# Altium footprint library General.PcbLib: 446 footprints (part 19 of 28)
Each footprint in its own frame and in the unit in brackets; x right, y up, seen from the top. Pads: shape width x height; smd on the part's side, far side on the other; paste and mask are expansions set on the pad; w line width, h text height; cw(c..) or ccw(c..) is an arc to the next point about the centre after c.
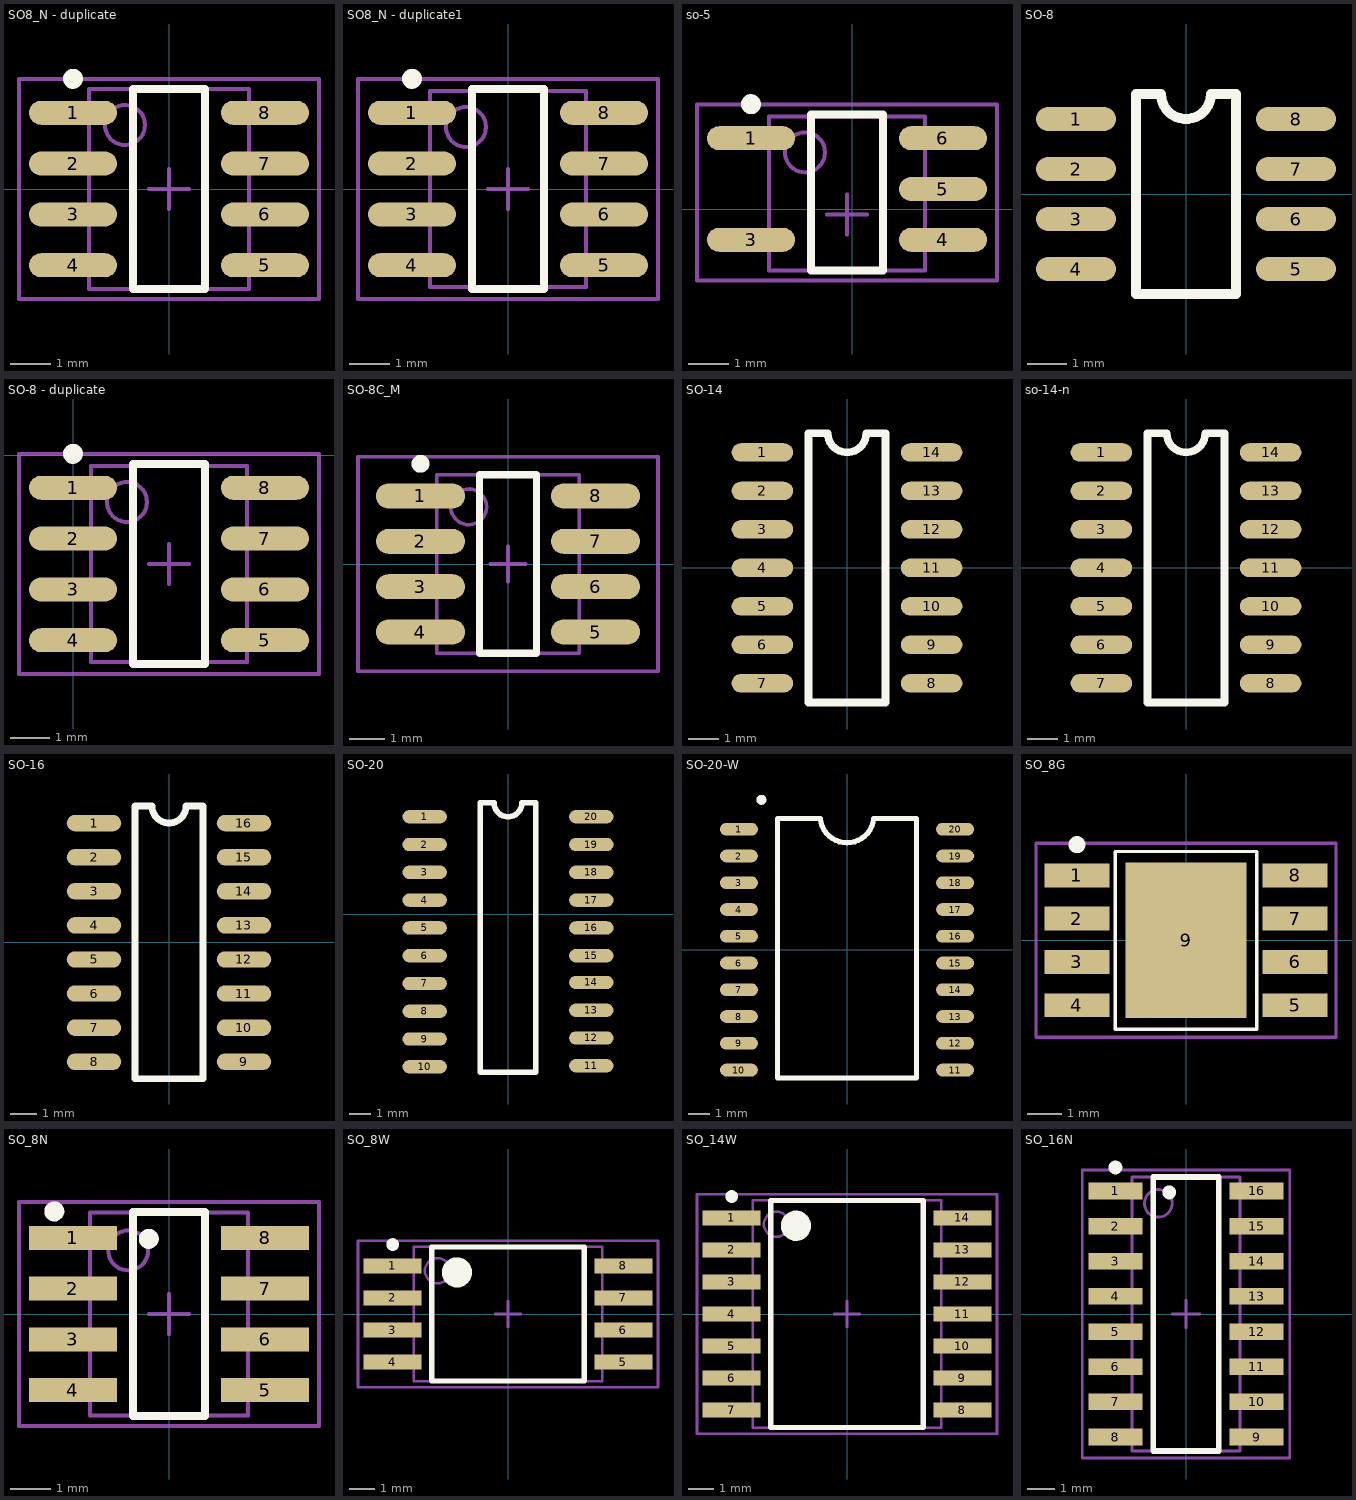
[diagram p18: the footprints below, top view; thin cyan lines are the x and y axes]

## SO8_N - duplicate [mm]
pads (8):
  oval 2.2x0.6 smd: 1(-2.4,1.905) 2(-2.4,0.635) 3(-2.4,-0.635) 4(-2.4,-1.905) 5(2.4,-1.905) 6(2.4,-0.635) 7(2.4,0.635) 8(2.4,1.905)
Top Overlay:
  circle w0.25: c-2.4,2.755 r0.125
  lines w0.2: -0.9,-2.5 -0.9,2.5 0.9,2.5 0.9,-2.5 -0.9,-2.5
Mechanical 13:
  circle w0.1: c-1.1,1.6 r0.5
  lines w0.1: -2,-2.5 -2,2.5 2,2.5 2,-2.5 -2,-2.5
Mechanical 15:
  lines w0.1: -0.5,0 0.5,0 ; 0,-0.5 0,0.5 ; -3.75,-2.75 -3.75,2.75 3.75,2.75 3.75,-2.75 -3.75,-2.75
3D body "NS 8SOP.step": height 1.7, standoff 0, extent -2.997,-2.413 2.997,2.413

## SO8_N - duplicate1 [mm] "SOIC, 8-Leads, Body 4.9x3.9mm, Pitch 1.27mm, IPC Medium Density"
height 1.75
pads (8):
  oval 2.2x0.6 smd: 1(-2.4,1.905) 2(-2.4,0.635) 3(-2.4,-0.635) 4(-2.4,-1.905) 5(2.4,-1.905) 6(2.4,-0.635) 7(2.4,0.635) 8(2.4,1.905)
Top Overlay:
  circle w0.25: c-2.4,2.755 r0.125
  lines w0.2: -0.9,-2.5 0.9,-2.5 0.9,2.5 -0.9,2.5 -0.9,-2.5
Mechanical 13:
  circle w0.1: c-1.05,1.55 r0.5
  lines w0.1: -1.95,-2.45 1.95,-2.45 1.95,2.45 -1.95,2.45 -1.95,-2.45
Mechanical 15:
  lines w0.1: -0.5,0 0.5,0 ; 0,-0.5 0,0.5 ; -3.75,-2.75 3.75,-2.75 3.75,2.75 -3.75,2.75 -3.75,-2.75
3D body: height 1.75, standoff 0, extent -1.95,-2.45 1.95,2.45

## so-5 [mm]
pads (5):
  oval 2.2x0.6 smd: 1(-2.527,1.778) 3(-2.527,-0.762) 4(2.273,-0.762) 5(2.273,0.508) 6(2.273,1.778)
Top Overlay:
  circle w0.25: c-2.527,2.628 r0.125
  lines w0.2: -1.027,-1.524 0.773,-1.524 0.773,2.373 -1.027,2.373 -1.027,-1.524
Mechanical 13:
  circle w0.1: c-1.177,1.423 r0.5
  lines w0.1: -2.077,-1.524 1.823,-1.524 1.823,2.323 -2.077,2.323 -2.077,-1.524
Mechanical 15:
  lines w0.1: -0.627,-0.127 0.373,-0.127 ; -0.127,-0.627 -0.127,0.373 ; -3.877,-1.778 3.623,-1.778 3.623,2.623 -3.877,2.623 -3.877,-1.778
3D body: height 1.75, standoff 0, extent -2.077,-1.524 1.823,2.323

## SO-8 [mil]
pads (8):
  oval 80x24 smd: 1(-110,75) 2(-110,25) 3(-110,-25) 4(-110,-75) 5(110,-75) 6(110,-25) 7(110,25) 8(110,75)
Top Overlay:
  lines w10: -50,-100 -50,100 -25,100 ccw(c0,100) 25,100 50,100 50,-100 -50,-100
3D body "SW3DPS-SO-8 (PIC12FXXX)-DEFAULT.STEP": height 63.6, standoff 0.6, extent -122.42,-98.11 113.41,94.8

## SO-8 - duplicate [mm]
pads (8):
  oval 2.2x0.6 smd: 1(-0.012,-0.813) 2(-0.012,-2.083) 3(-0.012,-3.353) 4(-0.012,-4.623) 5(4.788,-4.623) 6(4.788,-3.353) 7(4.788,-2.083) 8(4.788,-0.813)
Top Overlay:
  circle w0.25: c-0.012,0.037 r0.125
  lines w0.2: 1.488,-5.218 1.488,-0.218 3.288,-0.218 3.288,-5.218 1.488,-5.218
Mechanical 13:
  circle w0.1: c1.338,-1.168 r0.5
  lines w0.1: 0.438,-5.168 0.438,-0.268 4.338,-0.268 4.338,-5.168 0.438,-5.168
Mechanical 15:
  lines w0.1: 1.888,-2.718 2.888,-2.718 ; 2.388,-3.218 2.388,-2.218 ; -1.362,-5.468 -1.362,0.032 6.138,0.032 6.138,-5.468 -1.362,-5.468
3D body "SW3DPS-SO-8-DEFAULT.STEP": height 1.45, standoff 0, extent -0.527,-5.156 5.252,-0.254

## SO-8C_M [mm] "8-Pin Small Outline Integrated Circuit 1.27 mm Pitch, IPC Low Density"
height 1.75
pads (8):
  oval 2.5x0.7 smd: 1(-2.45,1.905) 2(-2.45,0.635) 3(-2.45,-0.635) 4(-2.45,-1.905) 5(2.45,-1.905) 6(2.45,-0.635) 7(2.45,0.635) 8(2.45,1.905)
Top Overlay:
  circle w0.25: c-2.45,2.805 r0.125
  lines w0.2: -0.8,-2.5 0.8,-2.5 0.8,2.5 -0.8,2.5 -0.8,-2.5
Mechanical 13:
  circle w0.1: c-1.1,1.6 r0.5
  lines w0.1: -2,-2.5 2,-2.5 2,2.5 -2,2.5 -2,-2.5
Mechanical 15:
  lines w0.1: -0.5,0 0.5,0 ; 0,-0.5 0,0.5 ; -4.2,-3 4.2,-3 4.2,3 -4.2,3 -4.2,-3
3D body "SW3DPS-SO-8 (PIC12FXXX)-DEFAULT.STEP": height 1.62, standoff 0.02, extent -3.057,-2.492 2.933,2.408

## SO-14 [mil]
pads (14):
  oval 80x24 smd: 1(-110,150) 2(-110,100) 3(-110,50) 4(-110,0) 5(-110,-50) 6(-110,-100) 7(-110,-150) 8(110,-150) 9(110,-100) 10(110,-50) 11(110,0) 12(110,50) 13(110,100) 14(110,150)
Top Overlay:
  lines w10: -50,-175 -50,175 -25,175 ccw(c0,175) 25,175 50,175 50,-175 -50,-175
3D body "SO-14.step": height 69, standoff 0, extent -120,-170 120,170

## so-14-n [mil]
pads (14):
  oval 80x24 smd: 1(-110,150) 2(-110,100) 3(-110,50) 4(-110,0) 5(-110,-50) 6(-110,-100) 7(-110,-150) 8(110,-150) 9(110,-100) 10(110,-50) 11(110,0) 12(110,50) 13(110,100) 14(110,150)
Top Overlay:
  lines w10: -50,-175 50,-175 50,175 25,175 cw(c0,175) -25,175 -50,175 -50,-175

## SO-16 [mil]
pads (16):
  oval 80x24 smd: 1(-110,175) 2(-110,125) 3(-110,75) 4(-110,25) 5(-110,-25) 6(-110,-75) 7(-110,-125) 8(-110,-175) 9(110,-175) 10(110,-125) 11(110,-75) 12(110,-25) 13(110,25) 14(110,75) 15(110,125) 16(110,175)
Top Overlay:
  lines w10: -50,-200 -50,200 -25,200 ccw(c0,200) 25,200 50,200 50,-200 -50,-200
3D body "SW3DPS-SO-16-DEFAULT.STEP": height 53.6, standoff -3.4, extent -118.26,-195.27 114.24,197.73

## SO-20 [mil]
pads (20):
  oval 80x24 smd: 1(-150,175) 2(-150,125) 3(-150,75) 4(-150,25) 5(-150,-25) 6(-150,-75) 7(-150,-125) 8(-150,-175) 9(-150,-225) 10(-150,-275) 11(150,-273.2) 12(150,-223.2) 13(150,-173.2) 14(150,-123.2) 15(150,-75) 16(150,-25) 17(150,25) 18(150,75) 19(150,125) 20(150,175)
Top Overlay:
  lines w10: -50,-284.69 -50,200 -25,200 ccw(c0,200) 25,200 50,200 50,-284.69 -50,-284.69

## SO-20-W [mil] "wide for 74hc541"
pads (20):
  oval 70.87x24 smd: 1(-202,225) 2(-202,175) 3(-202,125) 4(-202,75) 5(-202,25) 6(-202,-25) 7(-202,-75) 8(-202,-125) 9(-202,-175) 10(-202,-225) 11(202,-225) 12(202,-175) 13(202,-125) 14(202,-75) 15(202,-25) 16(202,25) 17(202,75) 18(202,125) 19(202,175) 20(202,225)
Top Overlay:
  circle w10: c-160,280 r4.24
  lines w10: -130,-240 130,-240 130,245 50,245 cw(c0,250) -50,245 -130,245 -130,-240
3D body "SO-20W.STEP": height -17, standoff -114.64, extent -202.95,-252.36 202.96,252.36

## SO_8G [mm] "SOIC, 8-Leads, Body 5.2x4.1mm (max), Pitch 1.27mm, IPC Medium Density"
height 2.413
pads (9):
  rect 1.9x0.7 smd: 1(-3.2,1.905) 2(-3.2,0.635) 3(-3.2,-0.635) 4(-3.2,-1.905) 5(3.2,-1.905) 6(3.2,-0.635) 7(3.2,0.635) 8(3.2,1.905)
  rect 3.556x4.572 smd: 9(0,0)
Top Overlay:
  circle w0.25: c-3.2,2.805 r0.125
  lines w0.1: -2.07,-2.605 -2.07,2.605 2.07,2.605 2.07,-2.605 -2.07,-2.605
Mechanical 13:
  circle w0.1: c-1.12,1.655 r0.5
Mechanical 15:
  lines w0.1: -0.5,0 0.5,0 ; 0,-0.5 0,0.5 ; -4.4,-2.85 4.4,-2.85 4.4,2.85 -4.4,2.85 -4.4,-2.85
3D body: height 2.41, standoff 0.18, extent -2.07,-2.605 2.07,2.605

## SO_8N [mm] "SOIC, 8-Leads, Body 5.1x3.9mm (max), Pitch 1.27mm, IPC Medium Density"
height 3.2
pads (8):
  rect 2.2x0.6 smd: 1(-2.4,1.905) 2(-2.4,0.635) 3(-2.4,-0.635) 4(-2.4,-1.905) 5(2.4,-1.905) 6(2.4,-0.635) 7(2.4,0.635) 8(2.4,1.905)
Top Overlay:
  circle w0.25: c-2.868,2.565 r0.125
  circle w0.25: c-0.506,1.88 r0.125
  lines w0.2: -0.9,-2.55 -0.9,2.55 0.9,2.55 0.9,-2.55 -0.9,-2.55
Mechanical 13:
  circle w0.1: c-1.02,1.59 r0.5
  lines w0.1: -1.97,-2.54 -1.97,2.54 1.97,2.54 1.97,-2.54 -1.97,-2.54
Mechanical 15:
  lines w0.1: -0.5,0 0.5,0 ; 0,-0.5 0,0.5 ; -3.75,-2.8 -3.75,2.8 3.75,2.8 3.75,-2.8 -3.75,-2.8
3D body "SW3dPS-Maxim_SOIC8.STEP": height 1.85, standoff 0, extent -3.048,-2.5 3.152,2.5

## SO_8W [mm] "SOIC, 8-Leads, Body 5.3x7.5mm (max), Pitch 1.27mm, IPC Medium Density"
height 2.54
pads (8):
  rect 2.3x0.6 smd: 1(-4.575,1.905) 2(-4.575,0.635) 3(-4.575,-0.635) 4(-4.575,-1.905) 5(4.575,-1.905) 6(4.575,-0.635) 7(4.575,0.635) 8(4.575,1.905)
Top Overlay:
  circle w0.6: c-2.025,1.65 r0.3
  circle w0.25: c-4.575,2.755 r0.125
  lines w0.2: -3.025,-2.65 3.025,-2.65 3.025,2.65 -3.025,2.65 -3.025,-2.65
Mechanical 13:
  circle w0.1: c-2.795,1.715 r0.5
  lines w0.1: -3.745,-2.665 3.745,-2.665 3.745,2.665 -3.745,2.665 -3.745,-2.665
Mechanical 15:
  lines w0.1: -0.5,0 0.5,0 ; 0,-0.5 0,0.5 ; -5.95,-2.9 5.95,-2.9 5.95,2.9 -5.95,2.9 -5.95,-2.9
3D body: height 2.54, standoff 0.2, extent -3.745,-2.665 3.745,2.665

## SO_14W [mm] "SOIC, 14-Leads, Body 9.0x7.5mm (max), Pitch 1.27mm, IPC Medium Density"
height 2.54
pads (14):
  rect 2.3x0.6 smd: 1(-4.575,3.81) 2(-4.575,2.54) 3(-4.575,1.27) 4(-4.575,0) 5(-4.575,-1.27) 6(-4.575,-2.54) 7(-4.575,-3.81) 8(4.575,-3.81) 9(4.575,-2.54) 10(4.575,-1.27) 11(4.575,0) 12(4.575,1.27) 13(4.575,2.54) 14(4.575,3.81)
Top Overlay:
  circle w0.6: c-2.025,3.5 r0.3
  circle w0.25: c-4.575,4.66 r0.125
  lines w0.2: -3.025,-4.5 3.025,-4.5 3.025,4.5 -3.025,4.5 -3.025,-4.5
Mechanical 13:
  circle w0.1: c-2.795,3.56 r0.5
  lines w0.1: -3.745,-4.51 3.745,-4.51 3.745,4.51 -3.745,4.51 -3.745,-4.51
Mechanical 15:
  lines w0.1: -0.5,0 0.5,0 ; 0,-0.5 0,0.5 ; -5.95,-4.75 5.95,-4.75 5.95,4.75 -5.95,4.75 -5.95,-4.75
3D body: height 2.54, standoff 0.2, extent -3.745,-4.51 3.745,4.51

## SO_16N [mm] "SOIC, 16-Leads, Body 9.9x3.9mm (max), Pitch 1.27mm, IPC Medium Density"
height 1.75
pads (16):
  rect 1.95x0.6 smd: 1(-2.55,4.445) 2(-2.55,3.175) 3(-2.55,1.905) 4(-2.55,0.635) 5(-2.55,-0.635) 6(-2.55,-1.905) 7(-2.55,-3.175) 8(-2.55,-4.445) 9(2.55,-4.445) 10(2.55,-3.175) 11(2.55,-1.905) 12(2.55,-0.635) 13(2.55,0.635) 14(2.55,1.905) 15(2.55,3.175) 16(2.55,4.445)
Top Overlay:
  circle w0.25: c-0.608,4.394 r0.125
  circle w0.25: c-2.55,5.295 r0.125
  lines w0.2: -1.175,-4.95 1.175,-4.95 1.175,4.95 -1.175,4.95 -1.175,-4.95
Mechanical 13:
  circle w0.1: c-1,4 r0.5
  lines w0.1: -1.95,-4.95 1.95,-4.95 1.95,4.95 -1.95,4.95 -1.95,-4.95
Mechanical 15:
  lines w0.1: -0.5,0 0.5,0 ; 0,-0.5 0,0.5 ; -3.75,-5.2 3.75,-5.2 3.75,5.2 -3.75,5.2 -3.75,-5.2
3D body: height 1.75, standoff 0.15, extent -1.95,-4.95 1.95,4.95